# Altium footprint library Libraries_2014_0618.PcbLib: 391 footprints (part 6 of 25)
Each footprint in its own frame and in the unit in brackets; x right, y up, seen from the top. Pads: shape width x height; smd on the part's side, far side on the other; paste and mask are expansions set on the pad; w line width, h text height; cw(c..) or ccw(c..) is an arc to the next point about the centre after c.
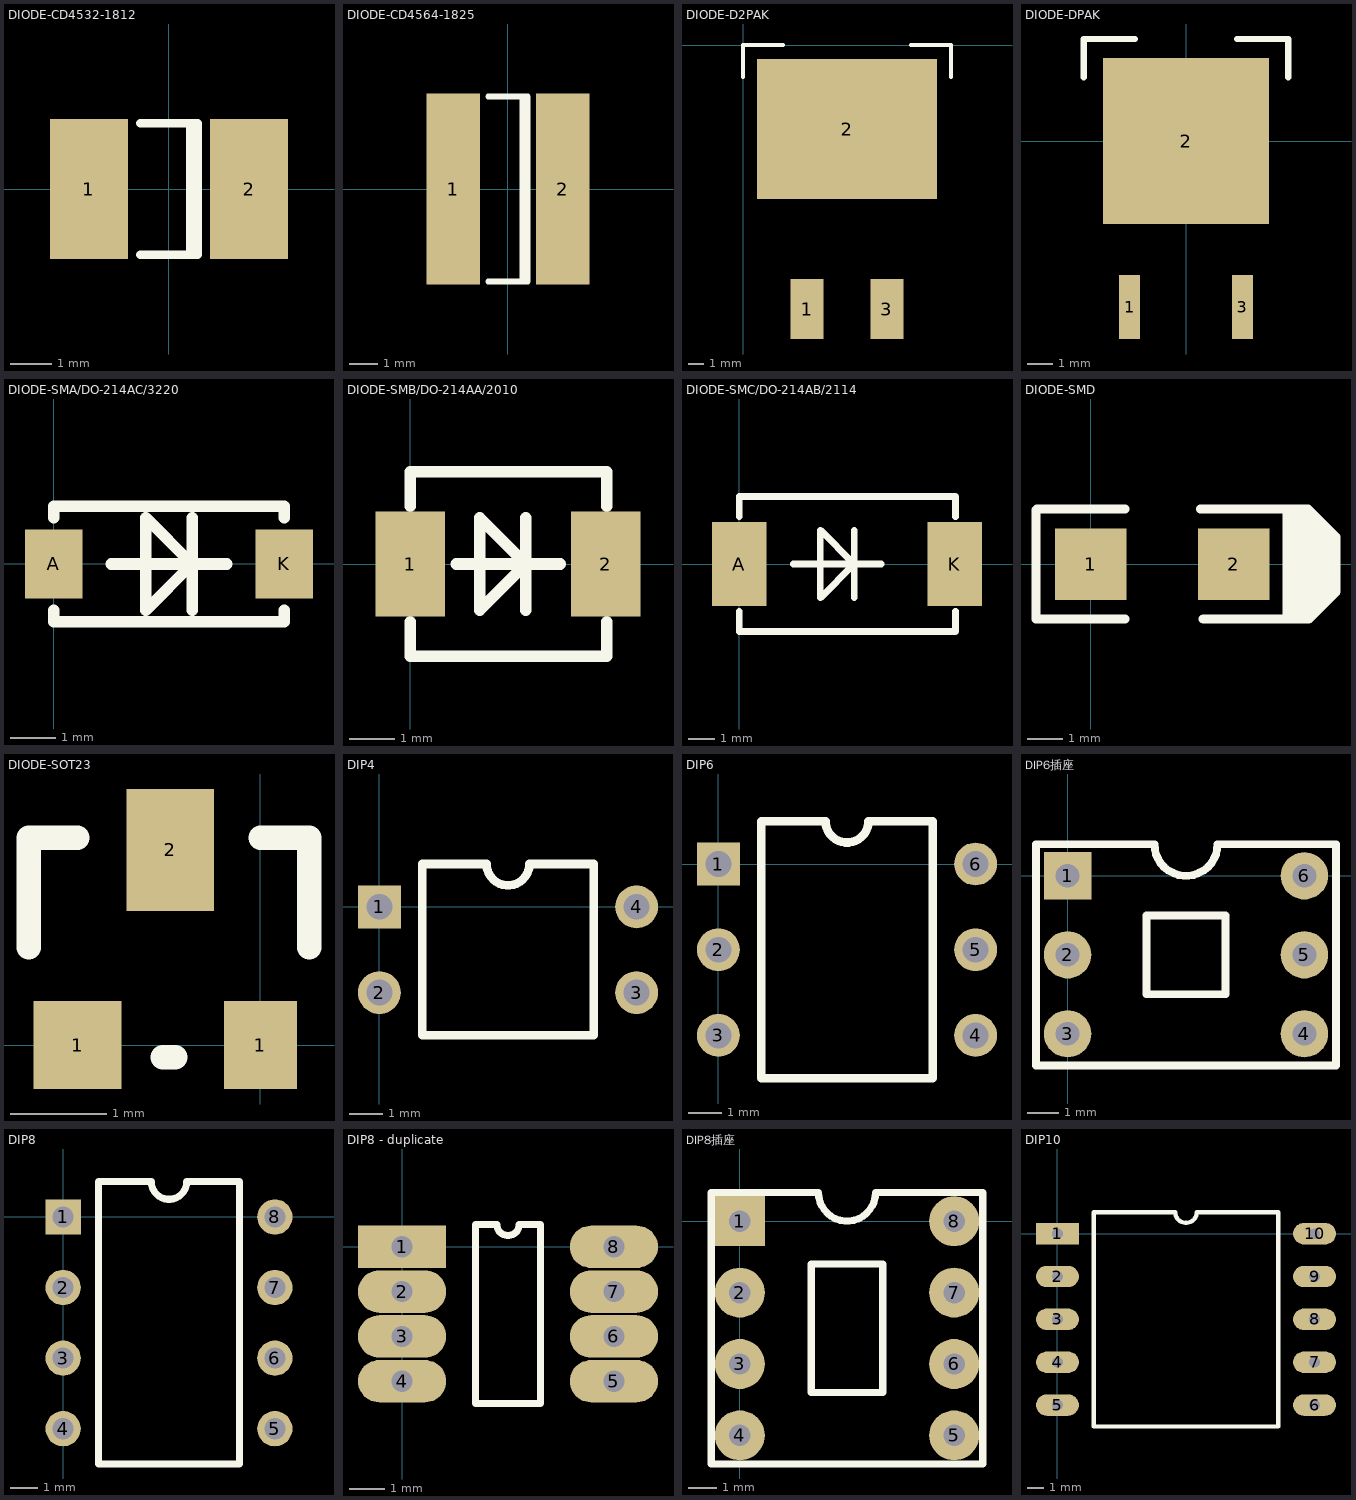
[diagram p5: the footprints below, top view; thin cyan lines are the x and y axes]

## DIODE-CD4532-1812 [mm] "Chip Diode; Body 4.5 x 3.2 mm (LxW typ)"
height 1.35
pads (2):
  rect 1.9x3.4 smd: 1(-1.95,0) 2(1.95,0)
Top Overlay:
  lines w0.2: -0.7,-1.6 0.7,-1.6 0.7,1.6 -0.7,1.6 ; 0.51,-1.6 0.51,1.6

## DIODE-CD4564-1825 [mm] "Chip Diode; Body 4.5 x 6.4 mm (LxW typ)"
height 1.1
pads (2):
  rect 1.9x6.8 smd: 1(-1.95,0) 2(1.95,0)
Top Overlay:
  lines w0.2: -0.7,-3.3 0.7,-3.3 0.7,3.3 -0.7,3.3 ; 0.51,-3.3 0.51,3.3

## DIODE-D2PAK [mil]
pads (3):
  rect 82x150 smd: 1(160,-660) 3(360,-660)
  rect 450x350 smd: 2(260,-210)
Top Overlay:
  lines w10: 0,-80 0,0 100,0 ; 420,0 520,0 520,-80

## DIODE-DPAK [mil]
pads (3):
  rect 33x100 smd: 1(-88.5,-260) 3(88.5,-260)
  rect 260x260 smd: 2(0,0)
Top Overlay:
  lines w10: -160,100 -160,160 -80,160 ; 80,160 160,160 160,100

## DIODE-SMA/DO-214AC/3220 [mil]
pads (2):
  rect 50x60 smd: A(0,0) K(200,0)
Top Overlay:
  lines w10: 0,-40 0,-50 50,-50 150,-50 200,-50 200,-40 ; 0,40 0,50 50,50 150,50 200,50 200,40 ; 50,0 60,0 140,0 ; 120,-40 120,40 ; 130,0 150,0 ; 80,-40 120,0 80,40 80,-40

## DIODE-SMB/DO-214AA/2010 [mm]
pads (2):
  rect 1.52x2.3 smd: 1(0,0) 2(4.3,0)
Top Overlay:
  lines w0.254: 0,-1.27 0,-2.032 4.318,-2.032 4.318,-1.27 ; 0,1.27 0,2.032 4.318,2.032 ; 1.016,0 3.302,0 ; 2.54,-1.016 2.54,1.016 ; 3.556,2.032 4.318,2.032 ; 4.318,1.27 4.318,2.032 ; 4.318,1.524 4.318,2.032 ; 1.524,-1.016 2.54,0 1.524,1.016 1.524,-1.016

## DIODE-SMC/DO-214AB/2114 [mil] "FOR IN5822 SK34 SK54"
height 88
pads (2):
  rect 80x125 smd: A(0,0) K(318.9,0)
Top Overlay:
  lines w10: 0,-70 0,-100 320,-100 320,-70 ; 0,70 0,100 320,100 320,70 ; 80,0 210,0 ; 170,-50 170,50 ; 120,-50 170,0 120,50 120,-50

## DIODE-SMD [mm]
pads (2):
  rect 2x2 smd: 1(0,0) 2(4,0)
Top Overlay:
  rectangle: 6.35,-0.762 6.858,-0.381
  rectangle: 6.325,-0.61 6.858,0.762
  rectangle: 6.223,-1.118 6.625,0.995
  rectangle: 5.486,-1.295 6.379,1.241
  rectangle: 5.486,-1.473 6.147,1.524
  lines w0.254: -1.524,1.524 -1.524,-1.524 0.965,-1.524 ; -1.499,1.549 0.965,1.549 ; 3.073,1.549 5.486,1.549 6.02,1.549 6.071,1.549 6.833,0.787 6.858,0.762 6.858,-0.762 6.147,-1.473 6.096,-1.524 5.486,-1.524 ; 3.15,-1.524 5.486,-1.524 ; 5.486,1.524 5.486,-1.524 ; 6.262,1.358 6.262,1.033 6.262,0.825 6.431,0.995 6.498,0.995 6.858,0.635 ; 6.579,-0.838 6.579,-0.61

## DIODE-SOT23 [mil]
pads (3):
  rect 36x36 smd: 1(-75,0)
  rect 30x36 smd: 1(0,0)
  rect 36x50 smd: 2(-37,80)
Top Overlay:
  lines w10: -95,40 -95,85 -75,85 ; -40,-5 -35,-5 ; 0,85 20,85 20,40

## DIP4 [mil]
pads (4):
  rect 50x50 hole 30: 1(0,0)
  round 50 hole 30: 2(0,-100) 3(300,-100) 4(300,0)
Top Overlay:
  lines w10: 50,-150 50,50 125,50 ccw(c150,50) 175,50 250,50 250,-150 50,-150

## DIP6 [mil]
pads (6):
  rect 50x50 hole 30: 1(0,0)
  round 50 hole 30: 2(0,-100) 3(0,-200) 4(300,-200) 5(300,-100) 6(300,0)
Top Overlay:
  lines w10: 50,-250 50,50 125,50 ccw(c150,50) 175,50 250,50 250,-250 50,-250

## DIP6插座 [mil]
pads (6):
  rect 60x60 hole 30: 1(0,0)
  round 60 hole 30: 2(0,-100) 3(0,-200) 4(300,-200) 5(300,-100) 6(300,0)
Top Overlay:
  lines w10: -40,-240 -40,40 110,40 ccw(c150,40) 190,40 340,40 340,-240 -40,-240 ; 100,-150 200,-150 200,-50 100,-50 100,-150

## DIP8 [mil]
pads (8):
  rect 50x50 hole 30: 1(0,0)
  round 50 hole 30: 2(0,-100) 3(0,-200) 4(0,-300) 5(300,-300) 6(300,-200) 7(300,-100) 8(300,0)
Top Overlay:
  lines w10: 50,-350 50,50 125,50 ccw(c150,50) 175,50 250,50 250,-350 50,-350

## DIP8 - duplicate [mm]
pads (8):
  rect 2.5x1.2 hole 0.6: 1(0,0)
  oval 2.5x1.2 hole 0.6: 2(0,-1.27) 3(0,-2.54) 4(0,-3.81) 5(6,-3.81) 6(6,-2.54) 7(6,-1.27) 8(6,0)
Top Overlay:
  lines w0.2: 2.085,-4.445 2.085,0.635 2.682,0.635 ccw(c3,0.635) 3.317,0.635 3.915,0.635 3.915,-4.445 2.085,-4.445

## DIP8插座 [mil]
pads (8):
  rect 70x70 hole 30: 1(0,0)
  round 70 hole 30: 2(0,-100) 3(0,-200) 4(0,-300) 5(300,-300) 6(300,-200) 7(300,-100) 8(300,0)
Top Overlay:
  lines w10: -40,-340 340,-340 340,40 190,40 cw(c150,40) 110,40 -40,40 -40,-340 ; 100,-240 100,-60 200,-60 200,-240 100,-240

## DIP10 [mil]
pads (10):
  rect 100x50 hole 25: 1(0,0)
  oval 100x50 hole 25: 2(0,-100) 3(0,-200) 4(0,-300) 5(0,-400) 6(600,-400) 7(600,-300) 8(600,-200) 9(600,-100) 10(600,0)
Top Overlay:
  lines w10: 85,-450 515,-450 515,50 325,50 cw(c300,50) 275,50 85,50 85,-450